# Altium schematic symbol library AliPadash.SchLib: 1186 symbols (part 4 of 6) (continued)
## R5.1K
designator R?, comment 5.1K
MFAC: 0603WAF5101T5E; JLC: C23186
footprint 0402
footprint AXIAL0.4
footprint 0402
footprint 0704
footprint 0402
footprint 0603
footprint 0603
pins: 1, 2
text: @DesignPCB

## R6.49M
designator R?, comment 6.49MΩ
MFAC: RTT036494FTP; JLC: C166778
footprint 0805
footprint AXIAL0.4
footprint 0402
footprint 0704
footprint 0603
footprint 0603
pins: 1, 2
text: @DesignPCB

## R7.5K
designator R?, comment 7.5KΩ
MFAC: 0603WAF7501T5E; JLC: C23234
footprint 0805
footprint AXIAL0.4
footprint 0402
footprint 0704
footprint 0603
pins: 1, 2
text: @DesignPCB

## R7K
designator R?, comment 75K
MFAC: 0603WAF7502T5E; JLC: C23242
footprint 0603
footprint AXIAL0.4
footprint 0402
footprint 0704
footprint 0603
pins: 1, 2

## R8.2KR
designator R?, comment 8.2KΩ
MFAC: 0603WAF8201T5E; JLC: C25981
footprint 0805
footprint AXIAL0.4
footprint 0402
footprint 0704
footprint 0603
footprint 0603
pins: 1, 2

## R10K
designator R?, comment 10KΩ
MFAC: 0603WAF1002T5E; JLC: C25804
footprint 0805
footprint AXIAL0.4
footprint 0402
footprint 0704
footprint 0603
pins: 1, 2
text: @DesignPCB

## R10K Array
designator R?, comment 10KΩ 4x0603
MFC: 4D03WGJ0103T5E; JLC: C29718
footprint 0603ARRAY
pins: 1 R1, 2 R2, 3 R3, 4 R4, 5 R5, 6 R6, 7 R7, 8 R8

## R10R
designator R?, comment 10Ω
MFAC: 0603WAF100JT5E; JLC: C22859
footprint 0805
footprint AXIAL0.4
footprint 0402
footprint 0704
footprint 0603
pins: 1, 2
text: @DesignPCB

## R12K
designator R?, comment 12KΩ
MFAC: 0603WAF1202T5E; JLC: C22790
footprint 0805
footprint AXIAL0.4
footprint 0402
footprint 0704
footprint 0603
footprint 0603
pins: 1, 2

## R15K
designator R?, comment 15KΩ
MFAC: 0603WAF1502T5E; JLC: C22809
footprint 0603
footprint AXIAL0.4
footprint 0402
footprint 0704
footprint 0603
footprint 0603
pins: 1, 2
text: @DesignPCB

## R20K
designator R?, comment 20KΩ
MFAC: 0603WAF2002T5E; JLC: C4184
footprint 0805
footprint AXIAL0.4
footprint 0402
footprint 0704
footprint 0603
footprint 0603
pins: 1, 2
text: @DesignPCB

## R22R Array
designator R?, comment 22Ω 4x0603
MFC: 4D03WGJ0220T5E; JLC: C12008
footprint 0603ARRAY
pins: 1 R1, 2 R2, 3 R3, 4 R4, 5 R5, 6 R6, 7 R7, 8 R8

## R25K
designator R?, comment 25KΩ
MFAC: CL10A225KO8NNNC; JLC: C23630
footprint 0805
footprint AXIAL0.4
footprint 0402
footprint 0704
footprint 0603
pins: 1, 2
text: @DesignPCB

## R27R
designator R?, comment 27Ω
MFAC: 0603WAF270JT5E; JLC: C25190
footprint 0603
footprint AXIAL0.4
footprint 0402
footprint 0704
footprint 0603
pins: 1, 2
text: @DesignPCB

## R33R
designator R?, comment 33Ω
MFAC: 0603WAF330JT5E; JLC: C23140
footprint 0805
footprint AXIAL0.4
footprint 0402
footprint 0704
footprint 0603
pins: 1, 2
text: @DesignPCB

## R47R
designator R?, comment 47Ω
MFAC: 0603WAF470JT5E; JLC: C23182
footprint 0805
footprint AXIAL0.4
footprint 0402
footprint 0704
footprint 0603
footprint 0603
pins: 1, 2
text: @DesignPCB

## R49.9R
designator R?, comment 49.9Ω
MFAC: 0603WAF499JT5E; JLC: C23185
footprint 0805
footprint AXIAL0.4
footprint 0402
footprint 0704
footprint 0603
pins: 1, 2
text: @DesignPCB

## R51K
designator R?, comment 51KΩ
MFAC: 0603WAF5102T5E; JLC: C23196
footprint 0805
footprint AXIAL0.4
footprint 0402
footprint 0704
footprint 0603
footprint 0603
pins: 1, 2
text: @DesignPCB

## R51K 0805
designator R?, comment 51KΩ 0805
MFAC: 0805W8F5102T5E; JLC: C17737
footprint 0805
footprint AXIAL0.4
footprint 0402
footprint 0704
footprint 0603
footprint 0603
pins: 1, 2
text: @DesignPCB

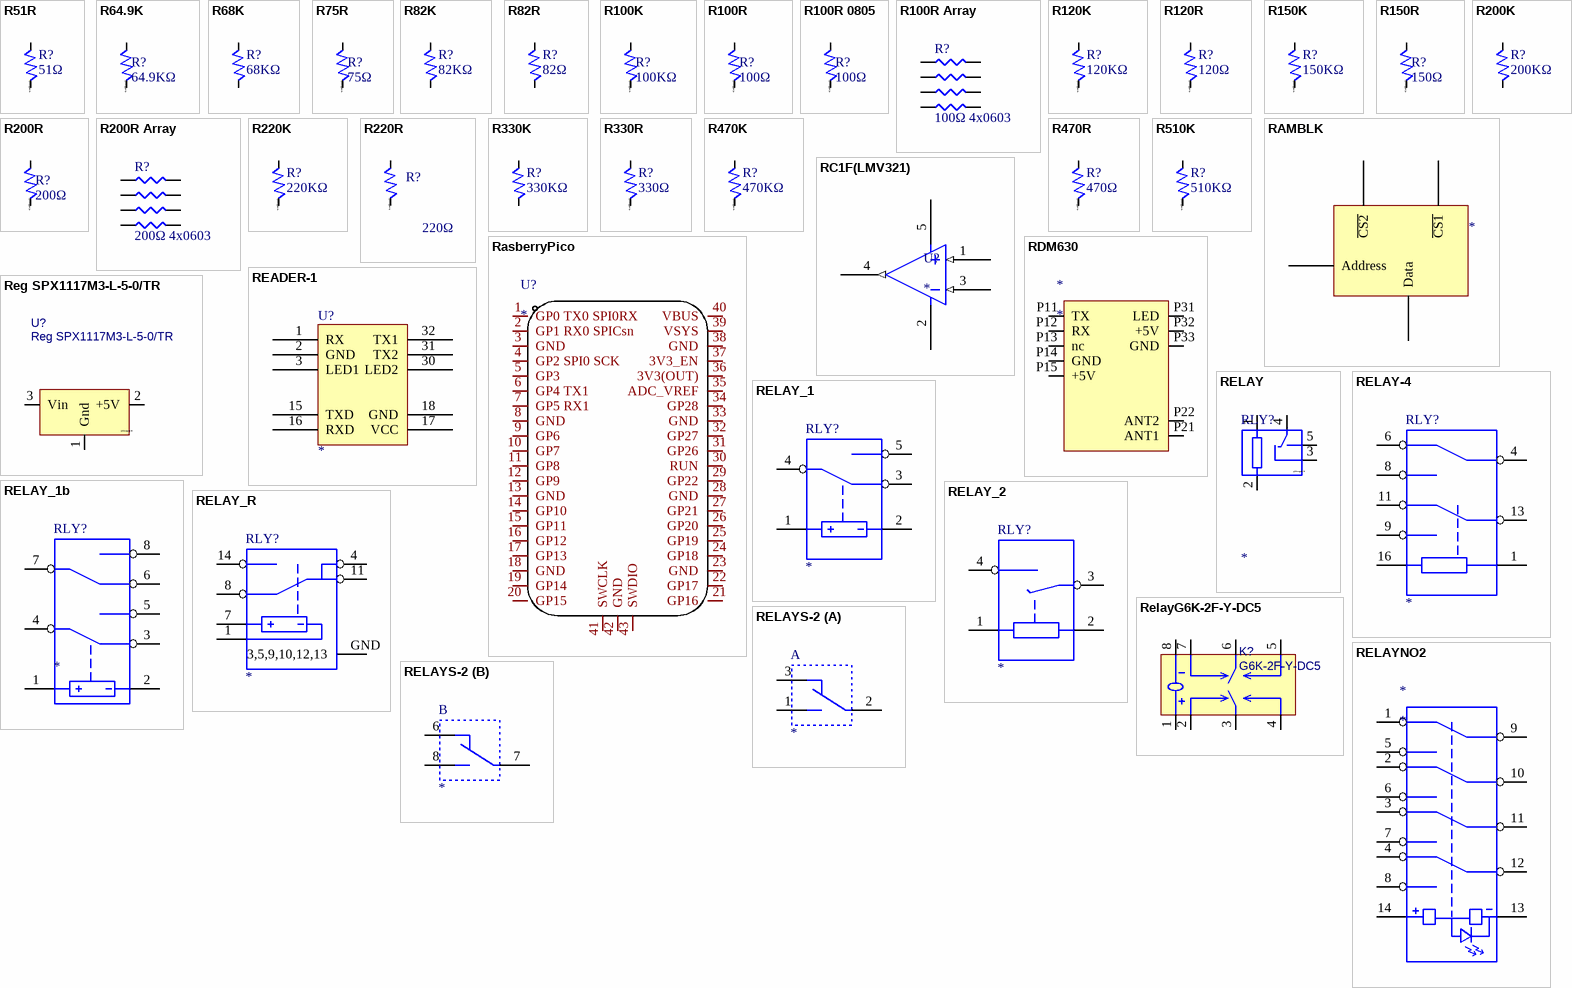
[diagram p50: symbols R51R to RELAYS-2]

## R51R
designator R?, comment 51Ω
Parameter 1: RTT058R20FTP; MFAC: 0603WAF510JT5E; JLC: C23197
footprint 0603
footprint AXIAL0.4
footprint 0402
footprint 0704
footprint 0603
pins: 1, 2
text: @DesignPCB

## R64.9K
designator R?, comment 64.9KΩ
MFAC: FRC0603F6492TS; JLC: C2960807
footprint 0805
footprint AXIAL0.4
footprint 0402
footprint 0704
footprint 0603
pins: 1, 2
text: @DesignPCB

## R68K
designator R?, comment 68KΩ
MFAC: 0603WAF6802T5E; JLC: C23231
footprint 0805
footprint AXIAL0.4
footprint 0402
footprint 0704
footprint 0603
footprint 0603
pins: 1, 2

## R75R
designator R?, comment 75Ω
MFAC: 0603WAF750JT5E; JLC: C4275
footprint 0805
footprint AXIAL0.4
footprint 0402
footprint 0704
footprint 0603
pins: 1, 2
text: @DesignPCB

## R82K
designator R?, comment 82KΩ
MFAC: 0603WAF8202T5E; JLC: C23254
footprint 0805
footprint AXIAL0.4
footprint 0402
footprint 0704
footprint 0603
footprint 0603
pins: 1, 2

## R82R
designator R?, comment 82Ω
MFAC: 0603WAF820JT5E; JLC: C23255
footprint 0805
footprint AXIAL0.4
footprint 0402
footprint 0704
footprint 0603
footprint 0603
pins: 1, 2

## R100K
designator R?, comment 100KΩ
MFAC: 0603WAF1003T5E; JLC: C25803
footprint 0805
footprint AXIAL0.4
footprint 0402
footprint 0704
footprint 0603
pins: 1, 2
text: @DesignPCB

## R100R
designator R?, comment 100Ω
MFAC: 0603WAF1000T5E; JLC: C22775
footprint 0805
footprint AXIAL0.4
footprint 0402
footprint 0704
footprint 0603
pins: 1, 2
text: @DesignPCB

## R100R 0805
designator R?, comment 100Ω
MFAC: 0805W8F1000T5E; JLC: C17408
footprint 0805
footprint AXIAL0.4
footprint 0402
footprint 0704
footprint 0805
pins: 1, 2
text: @DesignPCB

## R100R Array
designator R?, comment 100Ω 4x0603
MFAC: 4D03WGJ0101T5E; JLC: C25506
footprint 0603ARRAY
pins: 1 R1, 2 R2, 3 R3, 4 R4, 5 R5, 6 R6, 7 R7, 8 R8

## R120K
designator R?, comment 120KΩ
MFAC: 0603WAF1203T5E; JLC: C25808
footprint 0805
footprint AXIAL0.4
footprint 0402
footprint 0704
footprint 0603
pins: 1, 2
text: @DesignPCB

## R120R
designator R?, comment 120Ω
MFAC: 0603WAF1200T5E; JLC: C22787
footprint 0805
footprint AXIAL0.4
footprint 0402
footprint 0704
footprint 0603
footprint 0603
footprint 0603
pins: 1, 2
text: @DesignPCB

## R150K
designator R?, comment 150KΩ
MFAC: 0603WAF1503T5E; JLC: C22807
footprint 0805
footprint AXIAL0.4
footprint 0402
footprint 0704
footprint 0603
pins: 1, 2
text: @DesignPCB

## R150R
designator R?, comment 150Ω
MFAC: 0603WAF1500T5E; JLC: C22808
footprint 0805
footprint AXIAL0.4
footprint 0402
footprint 0704
footprint 0603
pins: 1, 2
text: @DesignPCB

## R200K
designator R?, comment 200KΩ
MFAC: 0603WAF2003T5E; JLC: C25811
footprint 0805
footprint AXIAL0.4
footprint 0402
footprint 0704
footprint 0603
footprint 0603
pins: 1, 2

## R200R
designator R?, comment 200Ω
MFAC: 0603WAF2000T5E; JLC: C8218
footprint 0805
footprint AXIAL0.4
footprint 0402
footprint 0704
footprint 0603
pins: 1, 2
text: @DesignPCB

## R200R Array
designator R?, comment 200Ω 4x0603
MFAC: RCML08W201JT; JLC: C525034
footprint 0603ARRAY
pins: 1 R1, 2 R2, 3 R3, 4 R4, 5 R5, 6 R6, 7 R7, 8 R8

## R220K
designator R?, comment 220KΩ
MFAC: 0603WAF2203T5E; JLC: C22961
footprint 0805
footprint AXIAL0.4
footprint 0402
footprint 0704
footprint 0603
footprint 0603
footprint 0603
pins: 1, 2
text: @DesignPCB

## R220R
designator R?, comment 220Ω
MFAC: 0603WAF2200T5E; JLC: C22962
footprint 0603
footprint AXIAL0.4
footprint 0402
footprint 0704
footprint 0603
pins: 1, 2
text: @DesignPCB

## R330K
designator R?, comment 330KΩ
MFAC: 0603WAF3303T5E; JLC: C23137
footprint 0603
footprint AXIAL0.4
footprint 0402
footprint 0704
footprint 0603
pins: 1, 2

## R330R
designator R?, comment 330Ω
MFAC: 0603WAF3300T5E; JLC: C23138
footprint 0603
footprint AXIAL0.4
footprint 0402
footprint 0704
footprint 0603
pins: 1, 2
text: @DesignPCB

## R470K
designator R?, comment 470KΩ
MFAC: 0603WAF4703T5E; JLC: C23178
footprint 0603
footprint AXIAL0.4
footprint 0402
footprint 0704
footprint 0603
pins: 1, 2
text: @DesignPCB

## R470R
designator R?, comment 470Ω
MFAC: 0603WAF4700T5E; JLC: C23179
footprint 0603
footprint AXIAL0.4
footprint 0402
footprint 0704
footprint 0603
pins: 1, 2
text: @DesignPCB

## R510K
designator R?, comment 510KΩ
MFAC: 0603WAF5103T5E; JLC: C23192
footprint 0603
footprint AXIAL0.4
footprint 0402
footprint 0704
footprint 0603
pins: 1, 2
text: @DesignPCB

## RAMBLK
designator ?
pins: ?1 ~{CS1}, ?2 ~{CS2}, ?3 Address, ?4 Data

## RasberryPico
designator U?
MFC: PICO; JLCPCB: C7203002
footprint RasberryPico
pins: 1 GP0 TX0 SPI0RX, 2 GP1 RX0 SPICsn, 3 GND, 4 GP2 SPI0 SCK, 5 GP3, 6 GP4 TX1, 7 GP5 RX1, 8 GND, 9 GP6, 10 GP7, 11 GP8, 12 GP9, 13 GND, 14 GP10, 15 GP11, 16 GP12, 17 GP13, 18 GND, 19 GP14, 20 GP15, 21 GP16, 22 GP17, 23 GND, 24 GP18, 25 GP19, 26 GP20, 27 GP21, 28 GND, 29 GP22, 30 RUN, 31 GP26, 32 GP27, 33 GND, 34 GP28, 35 ADC_VREF, 36 3V3(OUT), 37 3V3_EN, 38 GND, 39 VSYS, 40 VBUS, 41 SWCLK, 42 GND, 43 SWDIO

## RC1F(LMV321)
designator U?
footprint G5 (Footprint not found)
pins: 1 (in), 2, 3 (in), 4 (out), 5

## RDM630
designator *
footprint RDM630 (Footprint not found)
pins: P11 TX, P12 RX, P13 nc, P14 GND, P15 +5V, P21 ANT1, P22 ANT2, P31 LED, P32 +5V, P33 GND

## READER-1
designator U?
footprint READER-1
pins: 1 RX, 2 GND, 3 LED1, 15 TXD, 16 RXD, 17 VCC, 18 GND, 30 LED2, 31 TX2, 32 TX1

## Reg SPX1117M3-L-5-0/TR
designator U?
Manufacturer: MaxLinear; Supplier: LCSC; Manufacturer Part: SPX1117M3-L-5-0/TR; Supplier Part: C21946; JLCPCB Part Class: Extended Part; spicePre: U; spiceSymbolName: SPX1117M3-L-5-0/TR; JLC: C21946; MFAC: SPX1117M3-L-5-0/TR
footprint SOT-223-4_L6.5-W3.5-P2.30-LS7.0-BR
pins: 1 Gnd, 2 +5V, 3 Vin
text: @DesignPCB

## RELAY
designator RLY?
footprint RLYA
footprint Model Name (Footprint not found)
pins: 1, 2, 3, 4, 5
text: @DesignPCB

## RELAY-4
designator RLY?
footprint REL8B
pins: 1, 4, 6, 8, 9, 11, 13, 16

## RELAY_1
designator RLY?
footprint RLYA
pins: 1, 2, 3, 4, 5

## RELAY_1b
designator RLY?
footprint RLYA
pins: 1, 2, 3, 4, 5, 6, 7, 8

## RELAY_2
designator RLY?
footprint RLYA
pins: 1, 2, 3, 4

## RELAY_R
designator RLY?
footprint RLYA
pins: 1, 4, 7, 8, 11, 14, GND 3,5,9,10,12,13

## RelayG6K-2F-Y-DC5
designator K?, comment G6K-2F-Y-DC5
ManufacturerName: G6K-2F-Y-TR DC5; JLCPCB: C47190
footprint RelaySMD,6.5x10mm
pins: 1, 2, 3, 4, 5, 6, 7, 8

## RELAYNO2
designator *
pins: 1, 2, 3, 4, 5, 6, 7, 8, 9, 10, 11, 12, 13, 14

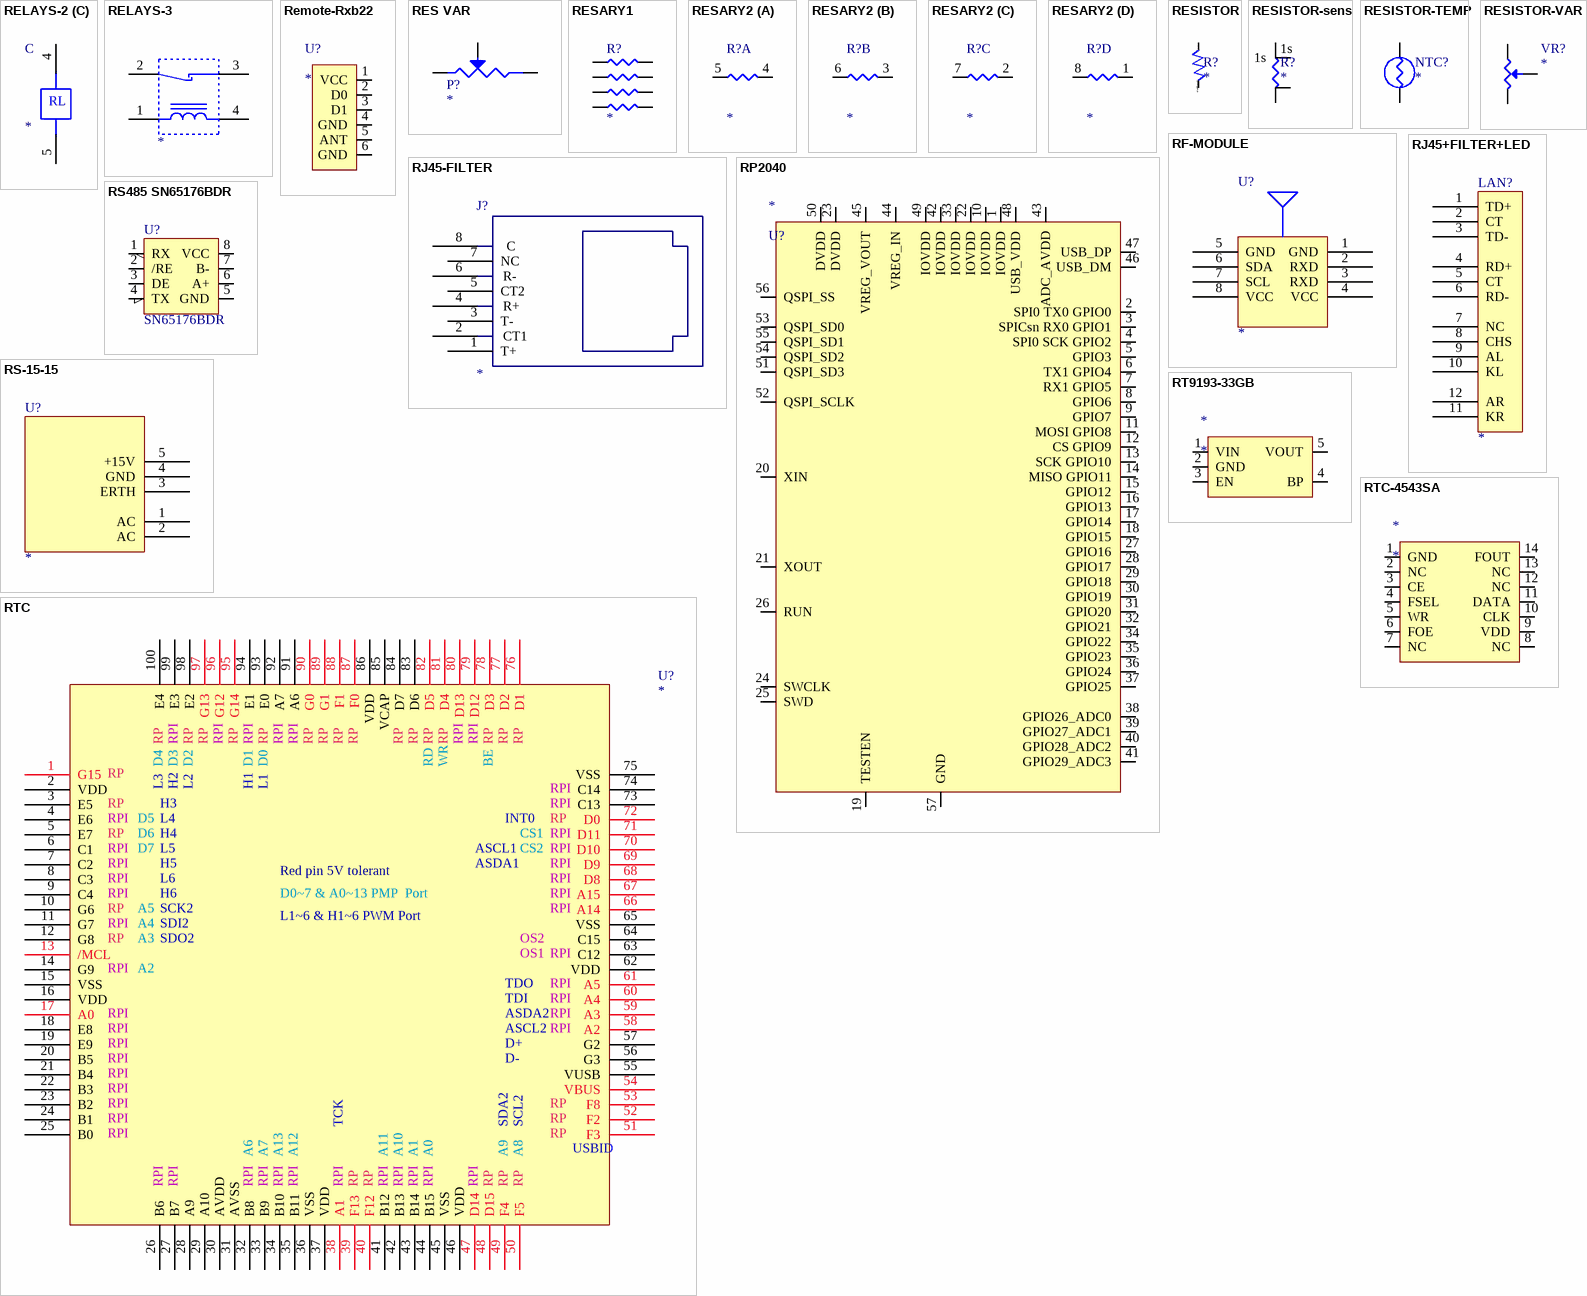
[diagram p51: symbols RELAYS-2 to RTC-4543SA]

## RELAYS-2
designator ?
Text Field1: REL8
part A pins: 1, 2, 3
part B pins: 6, 7, 8
part C pins: 4, 5
part C text: RL

## RELAYS-3
designator ?
pins: 1, 2, 3, 4

## Remote-Rxb22
designator U?
footprint remote-rxb22-433
pins: 1 VCC, 2 D0, 3 D1, 4 GND, 5 ANT, 6 GND

## RES VAR
designator P?
pins: 1, 2, 3

## RESARY1
designator R?
footprint 0603ARRAY
pins: 1 R1, 2 R2, 3 R3, 4 R4, 5 R5, 6 R6, 7 R7, 8 R8

## RESARY2
designator R?
footprint 1206ARRAY
footprint 0603ARRAY
part A pins: 4 R4, 5 R5
part B pins: 3 R3, 6 R6
part C pins: 2 R2, 7 R7
part D pins: 1 R1, 8 R8

## RESISTOR
designator R?
JLCPCB: *; ManufacturerName: *
footprint 0805
footprint AXIAL0.4
footprint 0402
footprint 0704
footprint 0603
pins: 1, 2
text: @DesignPCB

## RESISTOR-sens
designator R?
footprint 1005
footprint AXIAL0.4
footprint 0402
footprint 0704
footprint 2512-b (SMD-2512 - 6.3mm*3mm)
pins: 1, 1s, 2, 2s

## RESISTOR-TEMP
designator NTC?
footprint RAD0.3
pins: 1, 2

## RESISTOR-VAR
designator VR?
footprint VRSMD2
footprint VR7
footprint VR5
footprint VR9
pins: 1, 2, 3

## RF-MODULE
designator U?
footprint RF-MODULE1
pins: 1 GND, 2 RXD, 3 RXD, 4 VCC, 5 GND, 6 SDA, 7 SCL, 8 VCC

## RJ45+FILTER+LED
designator LAN?
footprint RJ45+FILTER+LED
pins: 1 TD+, 2 CT, 3 TD-, 4 RD+, 5 CT, 6 RD-, 7 NC, 8 CHS, 9 AL, 10 KL, 11 KR, 12 AR

## RJ45-FILTER
designator J?
footprint RG45
pins: 1 T+, 2      CT1, 3 T-, 4      R+, 5 CT2, 6      R-, 7 NC, 8       C

## RP2040
designator *, comment U?
MFAC: RP2040; JLC: C2040
footprint LQFN-56_L7.0-W7.0-P0.4-EP
pins: 1 IOVDD, 2 SPI0 TX0 GPIO0, 3 SPICsn RX0 GPIO1, 4 SPI0 SCK GPIO2, 5 GPIO3, 6 TX1 GPIO4, 7 RX1 GPIO5, 8 GPIO6, 9 GPIO7, 10 IOVDD, 11 MOSI GPIO8, 12 CS GPIO9, 13 SCK GPIO10, 14 MISO GPIO11, 15 GPIO12, 16 GPIO13, 17 GPIO14, 18 GPIO15, 19 TESTEN, 20 XIN, 21 XOUT, 22 IOVDD, 23 DVDD, 24 SWCLK, 25 SWD, 26 RUN, 27 GPIO16, 28 GPIO17, 29 GPIO18, 30 GPIO19, 31 GPIO20, 32 GPIO21, 33 IOVDD, 34 GPIO22, 35 GPIO23, 36 GPIO24, 37 GPIO25, 38 GPIO26_ADC0, 39 GPIO27_ADC1, 40 GPIO28_ADC2, 41 GPIO29_ADC3, 42 IOVDD, 43 ADC_AVDD, 44 VREG_IN, 45 VREG_VOUT, 46 USB_DM, 47 USB_DP, 48 USB_VDD, 49 IOVDD, 50 DVDD, 51 QSPI_SD3, 52 QSPI_SCLK, 53 QSPI_SD0, 54 QSPI_SD2, 55 QSPI_SD1, 56 QSPI_SS, 57 GND

## RS485 SN65176BDR
designator U?, comment SN65176BDR
JLC: C31302; MFAC: SN65176BDR
footprint SO-8
pins: 1 RX, 2 /RE, 3 DE, 4 TX, 5 GND, 6 A+, 7 B-, 8 VCC

## RS-15-15
designator U?
footprint PWR-MODL2
pins: 1 AC, 2 AC, 3 ERTH, 4 GND, 5 +15V

## RT9193-33GB
designator *
footprint SOT-23-5
pins: 1 VIN, 2 GND, 3 EN, 4 BP, 5 VOUT

## RTC
designator U?
footprint TQFP-100(FPGA)
pins: 1 G15, 2 VDD, 3 E5, 4 E6, 5 E7, 6 C1, 7 C2, 8 C3, 9 C4, 10 G6, 11 G7, 12 G8, 13 /MCL, 14 G9, 15 VSS, 16 VDD, 17 A0, 18 E8, 19 E9, 20 B5, 21 B4, 22 B3, 23 B2, 24 B1, 25 B0, 26 B6, 27 B7, 28 A9, 29 A10, 30 AVDD, 31 AVSS, 32 B8, 33 B9, 34 B10, 35 B11, 36 VSS, 37 VDD, 38 A1, 39 F13, 40 F12, 41 B12, 42 B13, 43 B14, 44 B15, 45 VSS, 46 VDD, 47 D14, 48 D15, 49 F4, 50 F5, 51 F3, 52 F2, 53 F8, 54 VBUS, 55 VUSB, 56 G3, 57 G2, 58 A2, 59 A3, 60 A4, 61 A5, 62 VDD, 63 C12, 64 C15, 65 VSS, 66 A14, 67 A15, 68 D8, 69 D9, 70 D10, 71 D11, 72 D0, 73 C13, 74 C14, 75 VSS, 76 D1, 77 D2, 78 D3, 79 D12, 80 D13, 81 D4, 82 D5, 83 D6, 84 D7, 85 VCAP, 86 VDD, 87 F0, 88 F1, 89 G1, 90 G0, 91 A6, 92 A7, 93 E0, 94 E1, 95 G14, 96 G12, 97 G13, 98 E2, 99 E3, 100 E4
text: RP; RPI; RD; WR; BE; L3; H2; L2; H1; L1; H3; L4; INT0; H4; CS1; L5; ASCL1; CS2; H5; ASDA1; Red pin 5V tolerant; L6; H6; D0~7 & A0~13 PMP  Port; SCK2; L1~6 & H1~6 PWM Port; SDI2; SDO2; OS2; OS1; TDO; TDI; ASDA2; ASCL2; D+; D-; TCK; SDA2; SCL2; A13; A12; A11; A8; USBID

## RTC-4543SA
designator *
pins: 1 GND, 2 NC, 3 CE, 4 FSEL, 5 WR, 6 FOE, 7 NC, 8 NC, 9 VDD, 10 CLK, 11 DATA, 12 NC, 13 NC, 14 FOUT

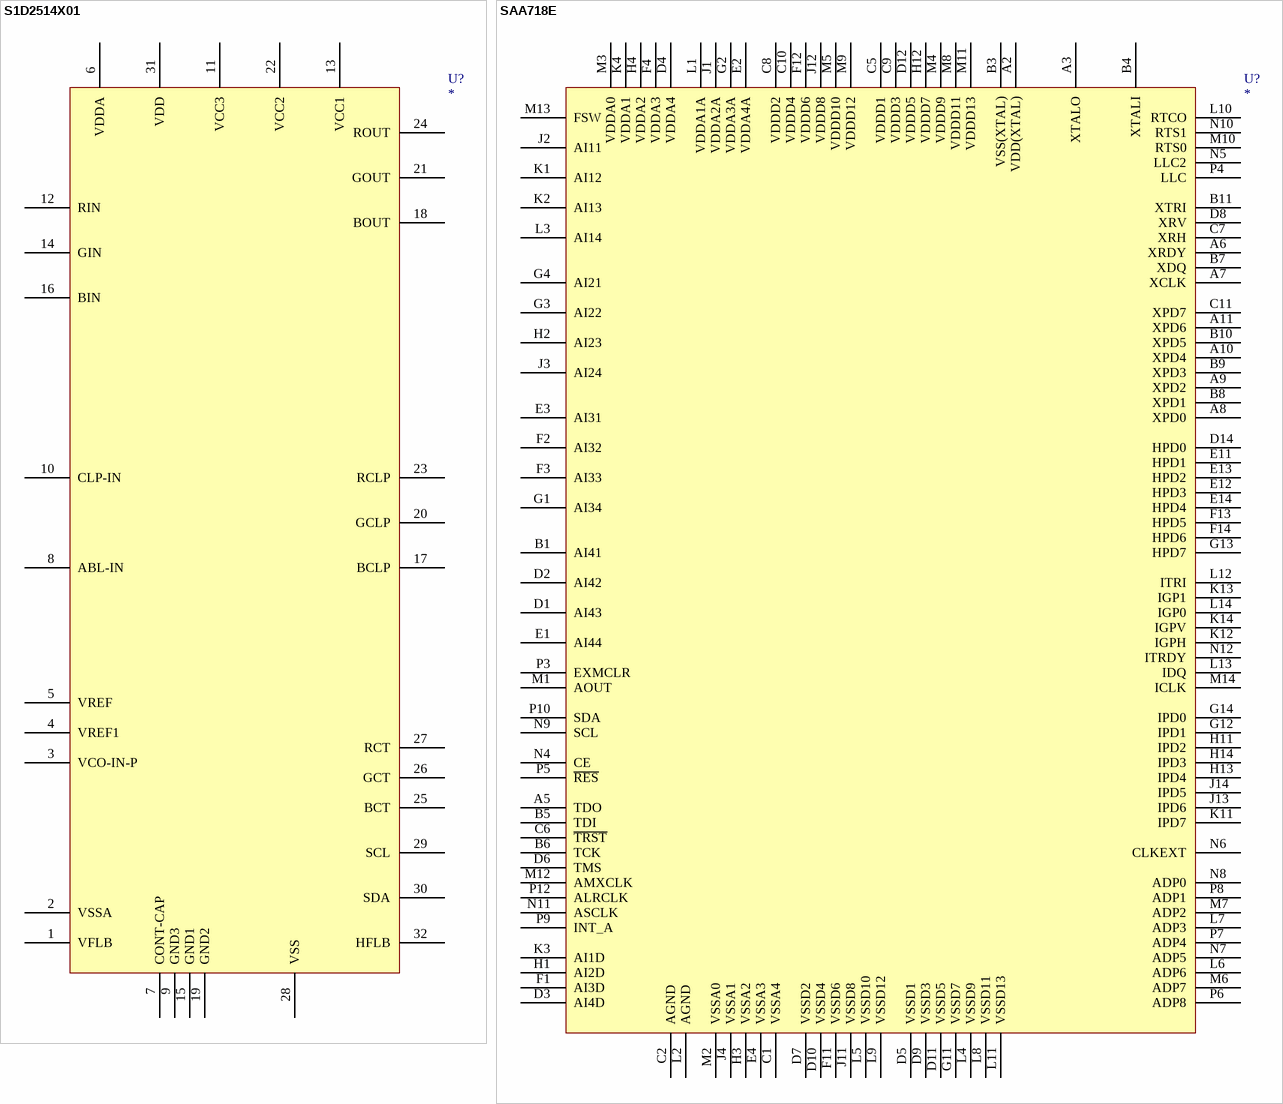
[diagram p52: symbols S1D2514X01 to SAA718E]

## S1D2514X01
designator U?
pins: 1 VFLB, 2 VSSA, 3 VCO-IN-P, 4 VREF1, 5 VREF, 6 VDDA, 7 CONT-CAP, 8 ABL-IN, 9 GND3, 10 CLP-IN, 11 VCC3, 12 RIN, 13 VCC1, 14 GIN, 15 GND1, 16 BIN, 17 BCLP, 18 BOUT, 19 GND2, 20 GCLP, 21 GOUT, 22 VCC2, 23 RCLP, 24 ROUT, 25 BCT, 26 GCT, 27 RCT, 28 VSS, 29 SCL, 30 SDA, 31 VDD, 32 HFLB

## SAA718E
designator U?
footprint BGA156X14
pins: A2 VDD(XTAL), A3 XTALO, A5 TDO, A6 XRDY, A7 XCLK, A8 XPD0, A9 XPD2, A10 XPD4, A11 XPD6, B1 AI41, B3 VSS(XTAL), B4 XTALI, B5 TDI, B6 TCK, B7 XDQ, B8 XPD1, B9 XPD3, B10 XPD5, B11 XTRI, C1 VSSA4, C2 AGND, C5 VDDD1, C6 ~{TRST}, C7 XRH, C8 VDDD2, C9 VDDD3, C10 VDDD4, C11 XPD7, D1 AI43, D2 AI42, D3 AI4D, D4 VDDA4, D5 VSSD1, D6 TMS, D7 VSSD2, D8 XRV, D9 VSSD3, D10 VSSD4, D11 VSSD5, D12 VDDD5, D14 HPD0, E1 AI44, E2 VDDA4A, E3 AI31, E4 VSSA3, E11 HPD1, E12 HPD3, E13 HPD2, E14 HPD4, F1 AI3D, F2 AI32, F3 AI33, F4 VDDA3, F11 VSSD6, F12 VDDD6, F13 HPD5, F14 HPD6, G1 AI34, G2 VDDA3A, G3 AI22, G4 AI21, G11 VSSD7, G12 IPD1, G13 HPD7, G14 IPD0, H1 AI2D, H2 AI23, H3 VSSA2, H4 VDDA2, H11 IPD2, H12 VDDD7, H13 IPD4, H14 IPD3, J1 VDDA2A, J2 AI11, J3 AI24, J4 VSSA1, J11 VSSD8, J12 VDDD8, J13 IPD6, J14 IPD5, K1 AI12, K2 AI13, K3 AI1D, K4 VDDA1, K11 IPD7, K12 IGPH, K13 IGP1, K14 IGPV, L1 VDDA1A, L2 AGND, L3 AI14, L4 VSSD9, L5 VSSD10, L6 ADP6, L7 ADP3, L8 VSSD11, L9 VSSD12, L10 RTCO, L11 VSSD13, L12 ITRI, L13 IDQ, L14 IGP0, M1 AOUT, M2 VSSA0, M3 VDDA0, M4 VDDD9, M5 VDDD10, M6 ADP7, M7 ADP2, M8 VDDD11, M9 VDDD12, M10 RTS0, M11 VDDD13, M12 AMXCLK, M13 FSW, M14 ICLK, N4 CE, N5 LLC2, N6 CLKEXT, N7 ADP5, N8 ADP0, N9 SCL, N10 RTS1, N11 ASCLK, N12 ITRDY, P3 EXMCLR, P4 LLC, P5 ~{RES}, P6 ADP8, P7 ADP4, P8 ADP1, P9 INT_A, P10 SDA, P12 ALRCLK

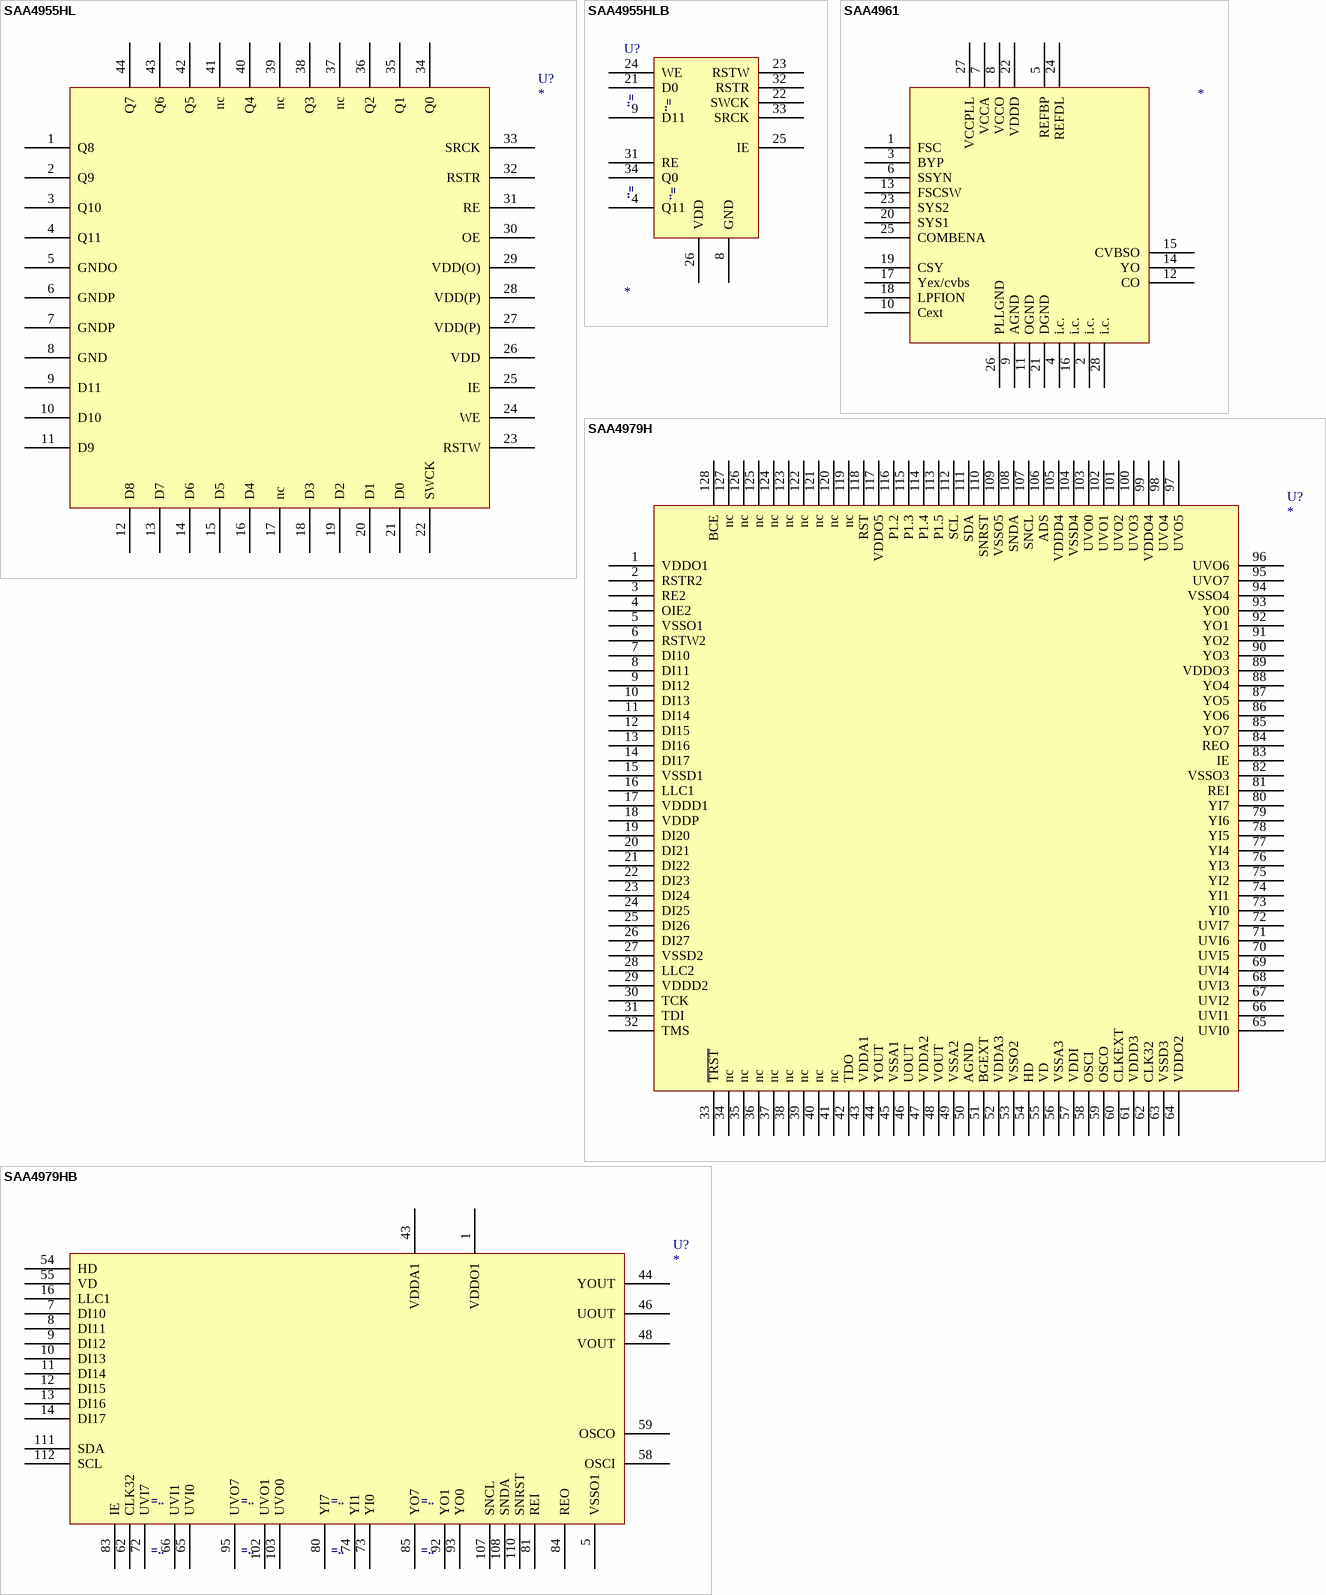
[diagram p53: symbols SAA4955HL to SAA4979HB]

## SAA4955HL
designator U?
footprint LQFP44
pins: 1 Q8, 2 Q9, 3 Q10, 4 Q11, 5 GNDO, 6 GNDP, 7 GNDP, 8 GND, 9 D11, 10 D10, 11 D9, 12 D8, 13 D7, 14 D6, 15 D5, 16 D4, 17 nc, 18 D3, 19 D2, 20 D1, 21 D0, 22 SWCK, 23 RSTW, 24 WE, 25 IE, 26 VDD, 27 VDD(P), 28 VDD(P), 29 VDD(O), 30 OE, 31 RE, 32 RSTR, 33 SRCK, 34 Q0, 35 Q1, 36 Q2, 37 nc, 38 Q3, 39 nc, 40 Q4, 41 nc, 42 Q5, 43 Q6, 44 Q7

## SAA4955HLB
designator U?
footprint LQFP44
pins: 4 Q11, 8 GND, 9 D11, 21 D0, 22 SWCK, 23 RSTW, 24 WE, 25 IE, 26 VDD, 31 RE, 32 RSTR, 33 SRCK, 34 Q0

## SAA4961
designator ?
pins: 1 FSC, 2 i.c., 3 BYP, 4 i.c., 5 REFBP, 6 SSYN, 7 VCCA, 8 VCCO, 9 AGND, 10 Cext, 11 OGND, 12 CO, 13 FSCSW, 14 YO, 15 CVBSO, 16 i.c., 17 Yex/cvbs, 18 LPFION, 19 CSY, 20 SYS1, 21 DGND, 22 VDDD, 23 SYS2, 24 REFDL, 25 COMBENA, 26 PLLGND, 27 VCCPLL, 28 i.c.

## SAA4979H
designator U?
footprint QFP-128
pins: 1 VDDO1, 2 RSTR2, 3 RE2, 4 OIE2, 5 VSSO1, 6 RSTW2, 7 DI10, 8 DI11, 9 DI12, 10 DI13, 11 DI14, 12 DI15, 13 DI16, 14 DI17, 15 VSSD1, 16 LLC1, 17 VDDD1, 18 VDDP, 19 DI20, 20 DI21, 21 DI22, 22 DI23, 23 DI24, 24 DI25, 25 DI26, 26 DI27, 27 VSSD2, 28 LLC2, 29 VDDD2, 30 TCK, 31 TDI, 32 TMS, 33 ~{TRST}, 34 nc, 35 nc, 36 nc, 37 nc, 38 nc, 39 nc, 40 nc, 41 nc, 42 TDO, 43 VDDA1, 44 YOUT, 45 VSSA1, 46 UOUT, 47 VDDA2, 48 VOUT, 49 VSSA2, 50 AGND, 51 BGEXT, 52 VDDA3, 53 VSSO2, 54 HD, 55 VD, 56 VSSA3, 57 VDDI, 58 OSCI, 59 OSCO, 60 CLKEXT, 61 VDDD3, 62 CLK32, 63 VSSD3, 64 VDDO2, 65 UVI0, 66 UVI1, 67 UVI2, 68 UVI3, 69 UVI4, 70 UVI5, 71 UVI6, 72 UVI7, 73 YI0, 74 YI1, 75 YI2, 76 YI3, 77 YI4, 78 YI5, 79 YI6, 80 YI7, 81 REI, 82 VSSO3, 83 IE, 84 REO, 85 YO7, 86 YO6, 87 YO5, 88 YO4, 89 VDDO3, 90 YO3, 91 YO2, 92 YO1, 93 YO0, 94 VSSO4, 95 UVO7, 96 UVO6, 97 UVO5, 98 UVO4, 99 VDDO4, 100 UVO3, 101 UVO2, 102 UVO1, 103 UVO0, 104 VSSD4, 105 VDDD4, 106 ADS, 107 SNCL, 108 SNDA, 109 VSSO5, 110 SNRST, 111 SDA, 112 SCL, 113 P1.5, 114 P1.4, 115 P1.3, 116 P1.2, 117 VDDO5, 118 RST, 119 nc, 120 nc, 121 nc, 122 nc, 123 nc, 124 nc, 125 nc, 126 nc, 127 nc, 128 BCE

## SAA4979HB
designator U?
footprint QFP-128
pins: 1 VDDO1, 5 VSSO1, 7 DI10, 8 DI11, 9 DI12, 10 DI13, 11 DI14, 12 DI15, 13 DI16, 14 DI17, 16 LLC1, 43 VDDA1, 44 YOUT, 46 UOUT, 48 VOUT, 54 HD, 55 VD, 58 OSCI, 59 OSCO, 62 CLK32, 65 UVI0, 66 UVI1, 72 UVI7, 73 YI0, 74 YI1, 80 YI7, 81 REI, 83 IE, 84 REO, 85 YO7, 92 YO1, 93 YO0, 95 UVO7, 102 UVO1, 103 UVO0, 107 SNCL, 108 SNDA, 110 SNRST, 111 SDA, 112 SCL

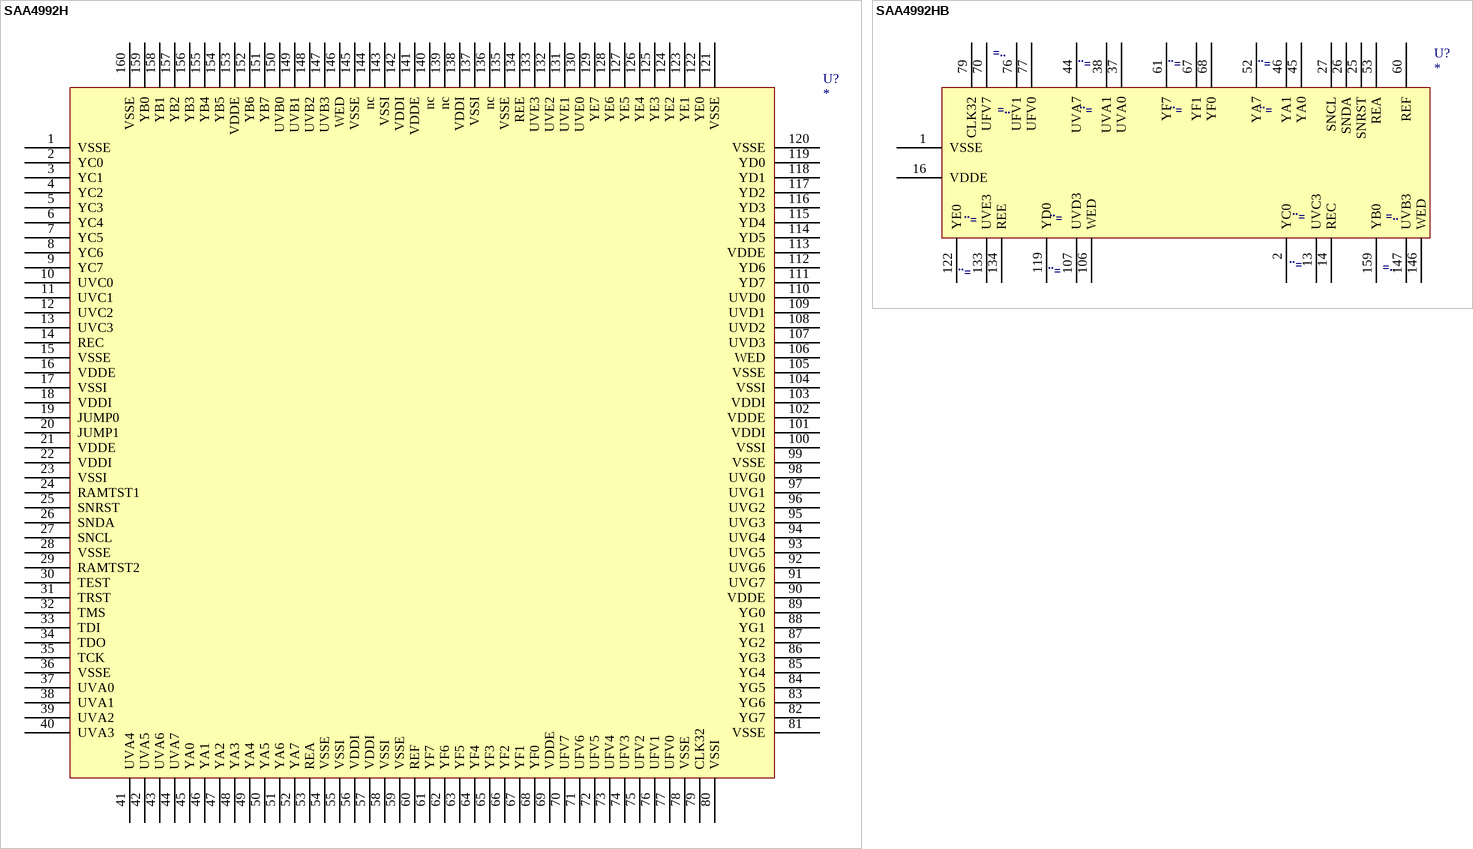
[diagram p54: symbols SAA4992H to SAA4992HB]

## SAA4992H
designator U?
pins: 1 VSSE, 2 YC0, 3 YC1, 4 YC2, 5 YC3, 6 YC4, 7 YC5, 8 YC6, 9 YC7, 10 UVC0, 11 UVC1, 12 UVC2, 13 UVC3, 14 REC, 15 VSSE, 16 VDDE, 17 VSSI, 18 VDDI, 19 JUMP0, 20 JUMP1, 21 VDDE, 22 VDDI, 23 VSSI, 24 RAMTST1, 25 SNRST, 26 SNDA, 27 SNCL, 28 VSSE, 29 RAMTST2, 30 TEST, 31 TRST, 32 TMS, 33 TDI, 34 TDO, 35 TCK, 36 VSSE, 37 UVA0, 38 UVA1, 39 UVA2, 40 UVA3, 41 UVA4, 42 UVA5, 43 UVA6, 44 UVA7, 45 YA0, 46 YA1, 47 YA2, 48 YA3, 49 YA4, 50 YA5, 51 YA6, 52 YA7, 53 REA, 54 VSSE, 55 VSSI, 56 VDDI, 57 VDDI, 58 VSSI, 59 VSSE, 60 REF, 61 YF7, 62 YF6, 63 YF5, 64 YF4, 65 YF3, 66 YF2, 67 YF1, 68 YF0, 69 VDDE, 70 UFV7, 71 UFV6, 72 UFV5, 73 UFV4, 74 UFV3, 75 UFV2, 76 UFV1, 77 UFV0, 78 VSSE, 79 CLK32, 80 VSSI, 81 VSSE, 82 YG7, 83 YG6, 84 YG5, 85 YG4, 86 YG3, 87 YG2, 88 YG1, 89 YG0, 90 VDDE, 91 UVG7, 92 UVG6, 93 UVG5, 94 UVG4, 95 UVG3, 96 UVG2, 97 UVG1, 98 UVG0, 99 VSSE, 100 VSSI, 101 VDDI, 102 VDDE, 103 VDDI, 104 VSSI, 105 VSSE, 106 WED, 107 UVD3, 108 UVD2, 109 UVD1, 110 UVD0, 111 YD7, 112 YD6, 113 VDDE, 114 YD5, 115 YD4, 116 YD3, 117 YD2, 118 YD1, 119 YD0, 120 VSSE, 121 VSSE, 122 YE0, 123 YE1, 124 YE2, 125 YE3, 126 YE4, 127 YE5, 128 YE6, 129 YE7, 130 UVE0, 131 UVE1, 132 UVE2, 133 UVE3, 134 REE, 135 VSSE, 136 nc, 137 VSSI, 138 VDDI, 139 nc, 140 nc, 141 VDDE, 142 VDDI, 143 VSSI, 144 nc, 145 VSSE, 146 WED, 147 UVB3, 148 UVB2, 149 UVB1, 150 UVB0, 151 YB7, 152 YB6, 153 VDDE, 154 YB5, 155 YB4, 156 YB3, 157 YB2, 158 YB1, 159 YB0, 160 VSSE

## SAA4992HB
designator U?
pins: 1 VSSE, 2 YC0, 13 UVC3, 14 REC, 16 VDDE, 25 SNRST, 26 SNDA, 27 SNCL, 37 UVA0, 38 UVA1, 44 UVA7, 45 YA0, 46 YA1, 52 YA7, 53 REA, 60 REF, 61 YF7, 67 YF1, 68 YF0, 70 UFV7, 76 UFV1, 77 UFV0, 79 CLK32, 106 WED, 107 UVD3, 119 YD0, 122 YE0, 133 UVE3, 134 REE, 146 WED, 147 UVB3, 159 YB0

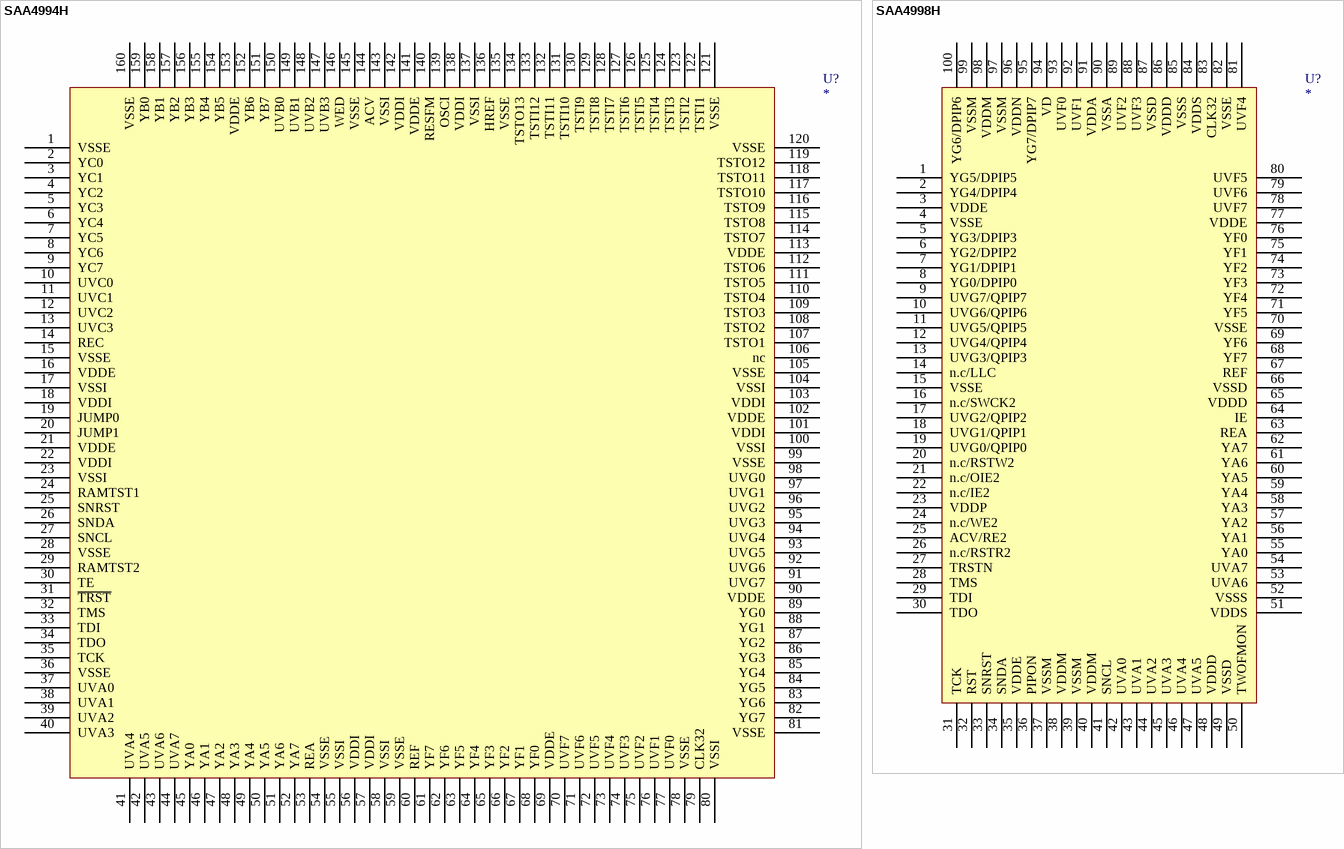
[diagram p55: symbols SAA4994H to SAA4998H]